# Altium footprint library Tomra_Cadstar_Footprints.PcbLib: 380 footprints (part 1 of 24) (continued)
## BGA138C100P13X13_1400X1400 [mm]
height 2.1
pads (157):
  round 0.5 smd paste+0 mask+0: 1(-6,-6) 2(-6,-4) 3(-6,-3) 4(-6,-2) 5(-6,-1) 6(-6,0) 7(-6,1) 8(-6,2) 9(-6,3) 10(-6,4) 11(-6,6) 12(-5,-4) 13(-5,-3) 14(-5,-2) 15(-5,-1) 16(-5,0) 17(-5,1) 18(-5,2) 19(-5,3) 20(-5,4) 21(-4,-6) 22(-4,-5) 23(-4,-4) 24(-4,-3) 25(-4,-2) 26(-4,-1) 27(-4,0) 28(-4,1) 29(-4,2) 30(-4,3) 31(-4,4) 32(-4,5) 33(-4,6) 34(-3,-6) 35(-3,-5) 36(-3,-4) 37(-3,-3) 38(-3,-2) 39(-3,-1) 40(-3,0) 41(-3,1) 42(-3,2) 43(-3,3) 44(-3,4) 45(-3,5) 46(-3,6) 47(-2,-6) 48(-2,-5) 49(-2,-4) 50(-2,-3) 51(-2,-2) 52(-2,-1) 53(-2,0) 54(-2,1) 55(-2,2) 56(-2,3) 57(-2,4) 58(-2,5) 59(-2,6) 60(-1,-6) 61(-1,-5) 62(-1,-4) 63(-1,-3) 69(-1,3) 70(-1,4) 71(-1,5) 72(-1,6) 73(0,-6) 74(0,-5) 75(0,-4) 76(0,-3) 82(0,3) 83(0,4) 84(0,5) 85(0,6) 86(1,-6) 87(1,-5) 88(1,-4) 89(1,-3) 95(1,3) 96(1,4) 97(1,5) 98(1,6) 99(2,-6) 100(2,-5) 101(2,-4) 102(2,-3) 103(2,-2) 104(2,-1) 105(2,0) 106(2,1) 107(2,2) 108(2,3) 109(2,4) 110(2,5) 111(2,6) 112(3,-6) 113(3,-5) 114(3,-4) 115(3,-3) 116(3,-2) 117(3,-1) 118(3,0) 119(3,1) 120(3,2) 121(3,3) 122(3,4) 123(3,5) 124(3,6) 125(4,-6) 126(4,-5) 127(4,-4) 128(4,-3) 129(4,-2) 130(4,-1) 131(4,0) 132(4,1) 133(4,2) 134(4,3) 135(4,4) 136(4,5) 137(4,6) 138(5,-4) 139(5,-3) 140(5,-2) 141(5,-1) 142(5,0) 143(5,1) 144(5,2) 145(5,3) 146(5,4) 147(6,-6) 148(6,-4) 149(6,-3) 150(6,-2) 151(6,-1) 152(6,0) 153(6,1) 154(6,2) 155(6,3) 156(6,4) 157(6,6)
  round 0 smd paste+0 mask+0: 64(-1,-2) 65(-1,-1) 66(-1,0) 67(-1,1) 68(-1,2) 77(0,-2) 78(0,-1) 79(0,0) 80(0,1) 81(0,2) 90(1,-2) 91(1,-1) 92(1,0) 93(1,1) 94(1,2)
Top Elec:
  region: 4.745,4.749 6.245,4.749 6.245,6.248 4.745,6.248
  region: -6.248,4.748 -4.748,4.748 -4.748,6.247 -6.248,6.247
  region: 4.747,-6.248 6.247,-6.248 6.247,-4.749 4.747,-4.749
  region: -6.252,-6.251 -4.752,-6.251 -4.751,-5.114 -5.107,-4.754 -6.252,-4.752
Top Silk:
  lines w0.1: -6.92,-6.71 -6.72,-6.91 ; -6.92,-6.51 -6.52,-6.91 ; -6.92,-6.31 -6.32,-6.91 ; -6.92,-6.11 -6.12,-6.91 ; -6.92,-5.91 -5.92,-6.91 ; -7,-7 7,-7 7,7 -7,7 -7,-7 ; -5.3,-7.725 cw(c-5.3,-7.6) -5.3,-7.475 cw(c-5.3,-7.6) -5.3,-7.725
  text ".Designator" at -3.599,7.27 h0.7
Top Assembly:
  lines w0.05: -6.92,-6.81 -6.82,-6.91 ; -6.92,-6.71 -6.72,-6.91 ; -6.92,-6.61 -6.62,-6.91 ; -6.92,-6.51 -6.52,-6.91 ; -6.92,-6.41 -6.42,-6.91 ; -6.92,-6.31 -6.32,-6.91 ; -6.92,-6.21 -6.22,-6.91 ; -6.92,-6.11 -6.12,-6.91 ; -6.92,-6.01 -6.02,-6.91 ; -6.92,-5.91 -5.92,-6.91 ; -7,-7 7,-7 7,7 -7,7 -7,-7
Top Placement:
  lines w0.01: -0.5,0 0.5,0 ; 0,-0.5 0,0.5 ; -8.5,-8.5 8.5,-8.5 8.5,8.5 -8.5,8.5 -8.5,-8.5

## BGA320C100P18X18_1900X1900 [mm]
height 2
pads (320):
  round 0.5 smd paste+0 mask+0: A1(-8.5,8.5) A2(-7.5,8.5) A3(-6.5,8.5) A4(-5.5,8.5) A5(-4.5,8.5) A6(-3.5,8.5) A7(-2.5,8.5) A8(-1.5,8.5) A9(-0.5,8.5) A10(0.5,8.5) A11(1.5,8.5) A12(2.5,8.5) A13(3.5,8.5) A14(4.5,8.5) A15(5.5,8.5) A16(6.5,8.5) A17(7.5,8.5) A18(8.5,8.5) B1(-8.5,7.5) B2(-7.5,7.5) B3(-6.5,7.5) B4(-5.5,7.5) B5(-4.5,7.5) B6(-3.5,7.5) B7(-2.5,7.5) B8(-1.5,7.5) B9(-0.5,7.5) B10(0.5,7.5) B11(1.5,7.5) B12(2.5,7.5) B13(3.5,7.5) B14(4.5,7.5) B15(5.5,7.5) B16(6.5,7.5) B17(7.5,7.5) B18(8.5,7.5) C1(-8.5,6.5) C2(-7.5,6.5) C3(-6.5,6.5) C4(-5.5,6.5) C5(-4.5,6.5) C6(-3.5,6.5) C7(-2.5,6.5) C8(-1.5,6.5) C9(-0.5,6.5) C10(0.5,6.5) C11(1.5,6.5) C12(2.5,6.5) C13(3.5,6.5) C14(4.5,6.5) C15(5.5,6.5) C16(6.5,6.5) C17(7.5,6.5) C18(8.5,6.5) D1(-8.5,5.5) D2(-7.5,5.5) D3(-6.5,5.5) D4(-5.5,5.5) D5(-4.5,5.5) D6(-3.5,5.5) D7(-2.5,5.5) D8(-1.5,5.5) D9(-0.5,5.5) D10(0.5,5.5) D11(1.5,5.5) D12(2.5,5.5) D13(3.5,5.5) D14(4.5,5.5) D15(5.5,5.5) D16(6.5,5.5) D17(7.5,5.5) D18(8.5,5.5) E1(-8.5,4.5) E2(-7.5,4.5) E3(-6.5,4.5) E4(-5.5,4.5) E5(-4.5,4.5) E6(-3.5,4.5) E7(-2.5,4.5) E8(-1.5,4.5) E9(-0.5,4.5) E10(0.5,4.5) E11(1.5,4.5) E12(2.5,4.5) E13(3.5,4.5) E14(4.5,4.5) E15(5.5,4.5) E16(6.5,4.5) E17(7.5,4.5) E18(8.5,4.5) F1(-8.5,3.5) F2(-7.5,3.5) F3(-6.5,3.5) F4(-5.5,3.5) F5(-4.5,3.5) F6(-3.5,3.5) F7(-2.5,3.5) F8(-1.5,3.5) F9(-0.5,3.5) F10(0.5,3.5) F11(1.5,3.5) F12(2.5,3.5) F13(3.5,3.5) F14(4.5,3.5) F15(5.5,3.5) F16(6.5,3.5) F17(7.5,3.5) F18(8.5,3.5) G1(-8.5,2.5) G2(-7.5,2.5) G3(-6.5,2.5) G4(-5.5,2.5) G5(-4.5,2.5) G6(-3.5,2.5) G7(-2.5,2.5) G8(-1.5,2.5) G9(-0.5,2.5) G10(0.5,2.5) G11(1.5,2.5) G12(2.5,2.5) G13(3.5,2.5) G14(4.5,2.5) G15(5.5,2.5) G16(6.5,2.5) G17(7.5,2.5) G18(8.5,2.5) H1(-8.5,1.5) H2(-7.5,1.5) H3(-6.5,1.5) H4(-5.5,1.5) H5(-4.5,1.5) H6(-3.5,1.5) H7(-2.5,1.5) H8(-1.5,1.5) H9(-0.5,1.5) H10(0.5,1.5) H11(1.5,1.5) H12(2.5,1.5) H13(3.5,1.5) H14(4.5,1.5) H15(5.5,1.5) H16(6.5,1.5) H17(7.5,1.5) H18(8.5,1.5) J1(-8.5,0.5) J2(-7.5,0.5) J3(-6.5,0.5) J4(-5.5,0.5) J5(-4.5,0.5) J6(-3.5,0.5) J7(-2.5,0.5) J8(-1.5,0.5) J11(1.5,0.5) J12(2.5,0.5) J13(3.5,0.5) J14(4.5,0.5) J15(5.5,0.5) J16(6.5,0.5) J17(7.5,0.5) J18(8.5,0.5) K1(-8.5,-0.5) K2(-7.5,-0.5) K3(-6.5,-0.5) K4(-5.5,-0.5) K5(-4.5,-0.5) K6(-3.5,-0.5) K7(-2.5,-0.5) K8(-1.5,-0.5) K11(1.5,-0.5) K12(2.5,-0.5) K13(3.5,-0.5) K14(4.5,-0.5) K15(5.5,-0.5) K16(6.5,-0.5) K17(7.5,-0.5) K18(8.5,-0.5) L1(-8.5,-1.5) L2(-7.5,-1.5) L3(-6.5,-1.5) L4(-5.5,-1.5) L5(-4.5,-1.5) L6(-3.5,-1.5) L7(-2.5,-1.5) L8(-1.5,-1.5) L9(-0.5,-1.5) L10(0.5,-1.5) L11(1.5,-1.5) L12(2.5,-1.5) L13(3.5,-1.5) L14(4.5,-1.5) L15(5.5,-1.5) L16(6.5,-1.5) L17(7.5,-1.5) L18(8.5,-1.5) M1(-8.5,-2.5) M2(-7.5,-2.5) M3(-6.5,-2.5) M4(-5.5,-2.5) M5(-4.5,-2.5) M6(-3.5,-2.5) M7(-2.5,-2.5) M8(-1.5,-2.5) M9(-0.5,-2.5) M10(0.5,-2.5) M11(1.5,-2.5) M12(2.5,-2.5) M13(3.5,-2.5) M14(4.5,-2.5) M15(5.5,-2.5) M16(6.5,-2.5) M17(7.5,-2.5) M18(8.5,-2.5) N1(-8.5,-3.5) N2(-7.5,-3.5) N3(-6.5,-3.5) N4(-5.5,-3.5) N5(-4.5,-3.5) N6(-3.5,-3.5) N7(-2.5,-3.5) N8(-1.5,-3.5) N9(-0.5,-3.5) N10(0.5,-3.5) N11(1.5,-3.5) N12(2.5,-3.5) N13(3.5,-3.5) N14(4.5,-3.5) N15(5.5,-3.5) N16(6.5,-3.5) N17(7.5,-3.5) N18(8.5,-3.5) P1(-8.5,-4.5) P2(-7.5,-4.5) P3(-6.5,-4.5) P4(-5.5,-4.5) P5(-4.5,-4.5) P6(-3.5,-4.5) P7(-2.5,-4.5) P8(-1.5,-4.5) P9(-0.5,-4.5) P10(0.5,-4.5) P11(1.5,-4.5) P12(2.5,-4.5) P13(3.5,-4.5) P14(4.5,-4.5) P15(5.5,-4.5) P16(6.5,-4.5) P17(7.5,-4.5) P18(8.5,-4.5) R1(-8.5,-5.5) R2(-7.5,-5.5) R3(-6.5,-5.5) R4(-5.5,-5.5) R5(-4.5,-5.5) R6(-3.5,-5.5) R7(-2.5,-5.5) R8(-1.5,-5.5) R9(-0.5,-5.5) R10(0.5,-5.5) R11(1.5,-5.5) R12(2.5,-5.5) R13(3.5,-5.5) R14(4.5,-5.5) R15(5.5,-5.5) R16(6.5,-5.5) R17(7.5,-5.5) R18(8.5,-5.5) T1(-8.5,-6.5) T2(-7.5,-6.5) T3(-6.5,-6.5) T4(-5.5,-6.5) T5(-4.5,-6.5) T6(-3.5,-6.5) T7(-2.5,-6.5) T8(-1.5,-6.5) T9(-0.5,-6.5) T10(0.5,-6.5) T11(1.5,-6.5) T12(2.5,-6.5) T13(3.5,-6.5) T14(4.5,-6.5) T15(5.5,-6.5) T16(6.5,-6.5) T17(7.5,-6.5) T18(8.5,-6.5) U1(-8.5,-7.5) U2(-7.5,-7.5) U3(-6.5,-7.5) U4(-5.5,-7.5) U5(-4.5,-7.5) U6(-3.5,-7.5) U7(-2.5,-7.5) U8(-1.5,-7.5) U9(-0.5,-7.5) U10(0.5,-7.5) U11(1.5,-7.5) U12(2.5,-7.5) U13(3.5,-7.5) U14(4.5,-7.5) U15(5.5,-7.5) U16(6.5,-7.5) U17(7.5,-7.5) U18(8.5,-7.5) V1(-8.5,-8.5) V2(-7.5,-8.5) V3(-6.5,-8.5) V4(-5.5,-8.5) V5(-4.5,-8.5) V6(-3.5,-8.5) V7(-2.5,-8.5) V8(-1.5,-8.5) V9(-0.5,-8.5) V10(0.5,-8.5) V11(1.5,-8.5) V12(2.5,-8.5) V13(3.5,-8.5) V14(4.5,-8.5) V15(5.5,-8.5) V16(6.5,-8.5) V17(7.5,-8.5) V18(8.5,-8.5)
Top Silk:
  lines w0.1: -9.5,8.5 -8.5,9.5 ; -9.5,8.7 -8.7,9.5 ; -9.5,8.9 -8.9,9.5 ; -9.5,9.1 -9.1,9.5 ; -9.5,9.3 -9.3,9.5 ; -10.225,8.5 cw(c-10.1,8.5) -9.975,8.5 cw(c-10.1,8.5) -10.225,8.5 ; -9.5,-9.5 -9.5,9.5 9.5,9.5 9.5,-9.5 -9.5,-9.5
  text ".Designator" at -9.5,9.5 h0.7
Top Assembly:
  lines w0.05: -9.5,8.5 -8.5,9.5 ; -9.5,8.6 -8.6,9.5 ; -9.5,8.7 -8.7,9.5 ; -9.5,8.8 -8.8,9.5 ; -9.5,8.9 -8.9,9.5 ; -9.5,9 -9,9.5 ; -9.5,9.1 -9.1,9.5 ; -9.5,9.2 -9.2,9.5 ; -9.5,9.3 -9.3,9.5 ; -9.5,9.4 -9.4,9.5 ; -9.5,-9.5 -9.5,9.5 9.5,9.5 9.5,-9.5 -9.5,-9.5
Top Placement:
  lines w0.01: -0.5,0 0.5,0 ; 0,-0.5 0,0.5 ; -11.5,-11.5 -11.5,11.5 11.5,11.5 11.5,-11.5 -11.5,-11.5

## BGA324C80P18X18_1500X1500 [mm]
height 1.5
pads (326):
  round 1 smd paste+0 mask+0: 1(-8.5,-8.5) 2(8.5,8.5)
  round 0.4 smd paste+0 mask+0: 3(-6.8,6.8) 4(-6,6.8) 5(-5.2,6.8) 6(-4.4,6.8) 7(-3.6,6.8) 8(-2.8,6.8) 9(-2,6.8) 10(-1.2,6.8) 11(-0.4,6.8) 12(0.4,6.8) 13(1.2,6.8) 14(2,6.8) 15(2.8,6.8) 16(3.6,6.8) 17(4.4,6.8) 18(5.2,6.8) 19(6,6.8) 20(6.8,6.8) 21(-6.8,6) 22(-6,6) 23(-5.2,6) 24(-4.4,6) 25(-3.6,6) 26(-2.8,6) 27(-2,6) 28(-1.2,6) 29(-0.4,6) 30(0.4,6) 31(1.2,6) 32(2,6) 33(2.8,6) 34(3.6,6) 35(4.4,6) 36(5.2,6) 37(6,6) 38(6.8,6) 39(-6.8,5.2) 40(-6,5.2) 41(-5.2,5.2) 42(-4.4,5.2) 43(-3.6,5.2) 44(-2.8,5.2) 45(-2,5.2) 46(-1.2,5.2) 47(-0.4,5.2) 48(0.4,5.2) 49(1.2,5.2) 50(2,5.2) 51(2.8,5.2) 52(3.6,5.2) 53(4.4,5.2) 54(5.2,5.2) 55(6,5.2) 56(6.8,5.2) 57(-6.8,4.4) 58(-6,4.4) 59(-5.2,4.4) 60(-4.4,4.4) 61(-3.6,4.4) 62(-2.8,4.4) 63(-2,4.4) 64(-1.2,4.4) 65(-0.4,4.4) 66(0.4,4.4) 67(1.2,4.4) 68(2,4.4) 69(2.8,4.4) 70(3.6,4.4) 71(4.4,4.4) 72(5.2,4.4) 73(6,4.4) 74(6.8,4.4) 75(-6.8,3.6) 76(-6,3.6) 77(-5.2,3.6) 78(-4.4,3.6) 79(-3.6,3.6) 80(-2.8,3.6) 81(-2,3.6) 82(-1.2,3.6) 83(-0.4,3.6) 84(0.4,3.6) 85(1.2,3.6) 86(2,3.6) 87(2.8,3.6) 88(3.6,3.6) 89(4.4,3.6) 90(5.2,3.6) 91(6,3.6) 92(6.8,3.6) 93(-6.8,2.8) 94(-6,2.8) 95(-5.2,2.8) 96(-4.4,2.8) 97(-3.6,2.8) 98(-2.8,2.8) 99(-2,2.8) 100(-1.2,2.8) 101(-0.4,2.8) 102(0.4,2.8) 103(1.2,2.8) 104(2,2.8) 105(2.8,2.8) 106(3.6,2.8) 107(4.4,2.8) 108(5.2,2.8) 109(6,2.8) 110(6.8,2.8) 111(-6.8,2) 112(-6,2) 113(-5.2,2) 114(-4.4,2) 115(-3.6,2) 116(-2.8,2) 117(-2,2) 118(-1.2,2) 119(-0.4,2) 120(0.4,2) 121(1.2,2) 122(2,2) 123(2.8,2) 124(3.6,2) 125(4.4,2) 126(5.2,2) 127(6,2) 128(6.8,2) 129(-6.8,1.2) 130(-6,1.2) 131(-5.2,1.2) 132(-4.4,1.2) 133(-3.6,1.2) 134(-2.8,1.2) 135(-2,1.2) 136(-1.2,1.2) 137(-0.4,1.2) 138(0.4,1.2) 139(1.2,1.2) 140(2,1.2) 141(2.8,1.2) 142(3.6,1.2) 143(4.4,1.2) 144(5.2,1.2) 145(6,1.2) 146(6.8,1.2) 147(-6.8,0.4) 148(-6,0.4) 149(-5.2,0.4) 150(-4.4,0.4) 151(-3.6,0.4) 152(-2.8,0.4) 153(-2,0.4) 154(-1.2,0.4) 155(-0.4,0.4) 156(0.4,0.4) 157(1.2,0.4) 158(2,0.4) 159(2.8,0.4) 160(3.6,0.4) 161(4.4,0.4) 162(5.2,0.4) 163(6,0.4) 164(6.8,0.4) 165(-6.8,-0.4) 166(-6,-0.4) 167(-5.2,-0.4) 168(-4.4,-0.4) 169(-3.6,-0.4) 170(-2.8,-0.4) 171(-2,-0.4) 172(-1.2,-0.4) 173(-0.4,-0.4) 174(0.4,-0.4) 175(1.2,-0.4) 176(2,-0.4) 177(2.8,-0.4) 178(3.6,-0.4) 179(4.4,-0.4) 180(5.2,-0.4) 181(6,-0.4) 182(6.8,-0.4) 183(-6.8,-1.2) 184(-6,-1.2) 185(-5.2,-1.2) 186(-4.4,-1.2) 187(-3.6,-1.2) 188(-2.8,-1.2) 189(-2,-1.2) 190(-1.2,-1.2) 191(-0.4,-1.2) 192(0.4,-1.2) 193(1.2,-1.2) 194(2,-1.2) 195(2.8,-1.2) 196(3.6,-1.2) 197(4.4,-1.2) 198(5.2,-1.2) 199(6,-1.2) 200(6.8,-1.2) 201(-6.8,-2) 202(-6,-2) 203(-5.2,-2) 204(-4.4,-2) 205(-3.6,-2) 206(-2.8,-2) 207(-2,-2) 208(-1.2,-2) 209(-0.4,-2) 210(0.4,-2) 211(1.2,-2) 212(2,-2) 213(2.8,-2) 214(3.6,-2) 215(4.4,-2) 216(5.2,-2) 217(6,-2) 218(6.8,-2) 219(-6.8,-2.8) 220(-6,-2.8) 221(-5.2,-2.8) 222(-4.4,-2.8) 223(-3.6,-2.8) 224(-2.8,-2.8) 225(-2,-2.8) 226(-1.2,-2.8) 227(-0.4,-2.8) 228(0.4,-2.8) 229(1.2,-2.8) 230(2,-2.8) 231(2.8,-2.8) 232(3.6,-2.8) 233(4.4,-2.8) 234(5.2,-2.8) 235(6,-2.8) 236(6.8,-2.8) 237(-6.8,-3.6) 238(-6,-3.6) 239(-5.2,-3.6) 240(-4.4,-3.6) 241(-3.6,-3.6) 242(-2.8,-3.6) 243(-2,-3.6) 244(-1.2,-3.6) 245(-0.4,-3.6) 246(0.4,-3.6) 247(1.2,-3.6) 248(2,-3.6) 249(2.8,-3.6) 250(3.6,-3.6) 251(4.4,-3.6) 252(5.2,-3.6) 253(6,-3.6) 254(6.8,-3.6) 255(-6.8,-4.4) 256(-6,-4.4) 257(-5.2,-4.4) 258(-4.4,-4.4) 259(-3.6,-4.4) 260(-2.8,-4.4) 261(-2,-4.4) 262(-1.2,-4.4) 263(-0.4,-4.4) 264(0.4,-4.4) 265(1.2,-4.4) 266(2,-4.4) 267(2.8,-4.4) 268(3.6,-4.4) 269(4.4,-4.4) 270(5.2,-4.4) 271(6,-4.4) 272(6.8,-4.4) 273(-6.8,-5.2) 274(-6,-5.2) 275(-5.2,-5.2) 276(-4.4,-5.2) 277(-3.6,-5.2) 278(-2.8,-5.2) 279(-2,-5.2) 280(-1.2,-5.2) 281(-0.4,-5.2) 282(0.4,-5.2) 283(1.2,-5.2) 284(2,-5.2) 285(2.8,-5.2) 286(3.6,-5.2) 287(4.4,-5.2) 288(5.2,-5.2) 289(6,-5.2) 290(6.8,-5.2) 291(-6.8,-6) 292(-6,-6) 293(-5.2,-6) 294(-4.4,-6) 295(-3.6,-6) 296(-2.8,-6) 297(-2,-6) 298(-1.2,-6) 299(-0.4,-6) 300(0.4,-6) 301(1.2,-6) 302(2,-6) 303(2.8,-6) 304(3.6,-6) 305(4.4,-6) 306(5.2,-6) 307(6,-6) 308(6.8,-6) 309(-6.8,-6.8) 310(-6,-6.8) 311(-5.2,-6.8) 312(-4.4,-6.8) 313(-3.6,-6.8) 314(-2.8,-6.8) 315(-2,-6.8) 316(-1.2,-6.8) 317(-0.4,-6.8) 318(0.4,-6.8) 319(1.2,-6.8) 320(2,-6.8) 321(2.8,-6.8) 322(3.6,-6.8) 323(4.4,-6.8) 324(5.2,-6.8) 325(6,-6.8) 326(6.8,-6.8)
Top Silk:
  lines w0.1: -7.85,6.8 cw(c-7.725,6.8) -7.6,6.8 cw(c-7.725,6.8) -7.85,6.8 ; -7.5,-7.5 -7.5,7 -7,7.5 7.5,7.5 7.5,-7.5 -7.5,-7.5
  text ".Designator" at -3.599,9.65 h0.7
Top Assembly:
  lines w0.05: -7.85,6.8 cw(c-7.725,6.8) -7.6,6.8 cw(c-7.725,6.8) -7.85,6.8 ; -7.5,-7.5 -7.5,7 -7,7.5 7.5,7.5 7.5,-7.5 -7.5,-7.5
Top Placement:
  lines w0.01: -0.5,0 0.5,0 ; 0,-0.5 0,0.5 ; -8.5,-8.5 -8.5,8.5 8.5,8.5 8.5,-8.5 -8.5,-8.5

## BGA676C100P26X26_2700X2700X337 (N) [mm]
height 3.37
pads (676):
  round 0.45 smd paste+0 mask+0: 1(-12.5,-12.5) 2(-12.5,-11.5) 3(-12.5,-10.5) 4(-12.5,-9.5) 5(-12.5,-8.5) 6(-12.5,-7.5) 7(-12.5,-6.5) 8(-12.5,-5.5) 9(-12.5,-4.5) 10(-12.5,-3.5) 11(-12.5,-2.5) 12(-12.5,-1.5) 13(-12.5,-0.5) 14(-12.5,0.5) 15(-12.5,1.5) 16(-12.5,2.5) 17(-12.5,3.5) 18(-12.5,4.5) 19(-12.5,5.5) 20(-12.5,6.5) 21(-12.5,7.5) 22(-12.5,8.5) 23(-12.5,9.5) 24(-12.5,10.5) 25(-12.5,11.5) 26(-12.5,12.5) 27(7.5,-12.5) 28(7.5,-11.5) 29(7.5,-10.5) 30(7.5,-9.5) 31(7.5,-8.5) 32(7.5,-7.5) 33(7.5,-6.5) 34(7.5,-5.5) 35(7.5,-4.5) 36(7.5,-3.5) 37(7.5,-2.5) 38(7.5,-1.5) 39(7.5,-0.5) 40(7.5,0.5) 41(7.5,1.5) 42(7.5,2.5) 43(7.5,3.5) 44(7.5,4.5) 45(7.5,5.5) 46(7.5,6.5) 47(7.5,7.5) 48(7.5,8.5) 49(7.5,9.5) 50(7.5,10.5) 51(7.5,11.5) 52(7.5,12.5) 53(8.5,-12.5) 54(8.5,-11.5) 55(8.5,-10.5) 56(8.5,-9.5) 57(8.5,-8.5) 58(8.5,-7.5) 59(8.5,-6.5) 60(8.5,-5.5) 61(8.5,-4.5) 62(8.5,-3.5) 63(8.5,-2.5) 64(8.5,-1.5) 65(8.5,-0.5) 66(8.5,0.5) 67(8.5,1.5) 68(8.5,2.5) 69(8.5,3.5) 70(8.5,4.5) 71(8.5,5.5) 72(8.5,6.5) 73(8.5,7.5) 74(8.5,8.5) 75(8.5,9.5) 76(8.5,10.5) 77(8.5,11.5) 78(8.5,12.5) 79(9.5,-12.5) 80(9.5,-11.5) 81(9.5,-10.5) 82(9.5,-9.5) 83(9.5,-8.5) 84(9.5,-7.5) 85(9.5,-6.5) 86(9.5,-5.5) 87(9.5,-4.5) 88(9.5,-3.5) 89(9.5,-2.5) 90(9.5,-1.5) 91(9.5,-0.5) 92(9.5,0.5) 93(9.5,1.5) 94(9.5,2.5) 95(9.5,3.5) 96(9.5,4.5) 97(9.5,5.5) 98(9.5,6.5) 99(9.5,7.5) 100(9.5,8.5) 101(9.5,9.5) 102(9.5,10.5) 103(9.5,11.5) 104(9.5,12.5) 105(10.5,-12.5) 106(10.5,-11.5) 107(10.5,-10.5) 108(10.5,-9.5) 109(10.5,-8.5) 110(10.5,-7.5) 111(10.5,-6.5) 112(10.5,-5.5) 113(10.5,-4.5) 114(10.5,-3.5) 115(10.5,-2.5) 116(10.5,-1.5) 117(10.5,-0.5) 118(10.5,0.5) 119(10.5,1.5) 120(10.5,2.5) 121(10.5,3.5) 122(10.5,4.5) 123(10.5,5.5) 124(10.5,6.5) 125(10.5,7.5) 126(10.5,8.5) 127(10.5,9.5) 128(10.5,10.5) 129(10.5,11.5) 130(10.5,12.5) 131(11.5,-12.5) 132(11.5,-11.5) 133(11.5,-10.5) 134(11.5,-9.5) 135(11.5,-8.5) 136(11.5,-7.5) 137(11.5,-6.5) 138(11.5,-5.5) 139(11.5,-4.5) 140(11.5,-3.5) 141(11.5,-2.5) 142(11.5,-1.5) 143(11.5,-0.5) 144(11.5,0.5) 145(11.5,1.5) 146(11.5,2.5) 147(11.5,3.5) 148(11.5,4.5) 149(11.5,5.5) 150(11.5,6.5) 151(11.5,7.5) 152(11.5,8.5) 153(11.5,9.5) 154(11.5,10.5) 155(11.5,11.5) 156(11.5,12.5) 157(12.5,-12.5) 158(12.5,-11.5) 159(12.5,-10.5) 160(12.5,-9.5) 161(12.5,-8.5) 162(12.5,-7.5) 163(12.5,-6.5) 164(12.5,-5.5) 165(12.5,-4.5) 166(12.5,-3.5) 167(12.5,-2.5) 168(12.5,-1.5) 169(12.5,-0.5) 170(12.5,0.5) 171(12.5,1.5) 172(12.5,2.5) 173(12.5,3.5) 174(12.5,4.5) 175(12.5,5.5) 176(12.5,6.5) 177(12.5,7.5) 178(12.5,8.5) 179(12.5,9.5) 180(12.5,10.5) 181(12.5,11.5) 182(12.5,12.5) 183(-11.5,-12.5) 184(-11.5,-11.5) 185(-11.5,-10.5) 186(-11.5,-9.5) 187(-11.5,-8.5) 188(-11.5,-7.5) 189(-11.5,-6.5) 190(-11.5,-5.5) 191(-11.5,-4.5) 192(-11.5,-3.5) 193(-11.5,-2.5) 194(-11.5,-1.5) 195(-11.5,-0.5) 196(-11.5,0.5) 197(-11.5,1.5) 198(-11.5,2.5) 199(-11.5,3.5) 200(-11.5,4.5) 201(-11.5,5.5) 202(-11.5,6.5) 203(-11.5,7.5) 204(-11.5,8.5) 205(-11.5,9.5) 206(-11.5,10.5) 207(-11.5,11.5) 208(-11.5,12.5) 209(-10.5,-12.5) 210(-10.5,-11.5) 211(-10.5,-10.5) 212(-10.5,-9.5) 213(-10.5,-8.5) 214(-10.5,-7.5) 215(-10.5,-6.5) 216(-10.5,-5.5) 217(-10.5,-4.5) 218(-10.5,-3.5) 219(-10.5,-2.5) 220(-10.5,-1.5) 221(-10.5,-0.5) 222(-10.5,0.5) 223(-10.5,1.5) 224(-10.5,2.5) 225(-10.5,3.5) 226(-10.5,4.5) 227(-10.5,5.5) 228(-10.5,6.5) 229(-10.5,7.5) 230(-10.5,8.5) 231(-10.5,9.5) 232(-10.5,10.5) 233(-10.5,11.5) 234(-10.5,12.5) 235(-9.5,-12.5) 236(-9.5,-11.5) 237(-9.5,-10.5) 238(-9.5,-9.5) 239(-9.5,-8.5) 240(-9.5,-7.5) 241(-9.5,-6.5) 242(-9.5,-5.5) 243(-9.5,-4.5) 244(-9.5,-3.5) 245(-9.5,-2.5) 246(-9.5,-1.5) 247(-9.5,-0.5) 248(-9.5,0.5) 249(-9.5,1.5) 250(-9.5,2.5) 251(-9.5,3.5) 252(-9.5,4.5) 253(-9.5,5.5) 254(-9.5,6.5) 255(-9.5,7.5) 256(-9.5,8.5) 257(-9.5,9.5) 258(-9.5,10.5) 259(-9.5,11.5) 260(-9.5,12.5) 261(-8.5,-12.5) 262(-8.5,-11.5) 263(-8.5,-10.5) 264(-8.5,-9.5) 265(-8.5,-8.5) 266(-8.5,-7.5) 267(-8.5,-6.5) 268(-8.5,-5.5) 269(-8.5,-4.5) 270(-8.5,-3.5) 271(-8.5,-2.5) 272(-8.5,-1.5) 273(-8.5,-0.5) 274(-8.5,0.5) 275(-8.5,1.5) 276(-8.5,2.5) 277(-8.5,3.5) 278(-8.5,4.5) 279(-8.5,5.5) 280(-8.5,6.5) 281(-8.5,7.5) 282(-8.5,8.5) 283(-8.5,9.5) 284(-8.5,10.5) 285(-8.5,11.5) 286(-8.5,12.5) 287(-7.5,-12.5) 288(-7.5,-11.5) 289(-7.5,-10.5) 290(-7.5,-9.5) 291(-7.5,-8.5) 292(-7.5,-7.5) 293(-7.5,-6.5) 294(-7.5,-5.5) 295(-7.5,-4.5) 296(-7.5,-3.5) 297(-7.5,-2.5) 298(-7.5,-1.5) 299(-7.5,-0.5) 300(-7.5,0.5) 301(-7.5,1.5) 302(-7.5,2.5) 303(-7.5,3.5) 304(-7.5,4.5) 305(-7.5,5.5) 306(-7.5,6.5) 307(-7.5,7.5) 308(-7.5,8.5) 309(-7.5,9.5) 310(-7.5,10.5) 311(-7.5,11.5) 312(-7.5,12.5) 313(-6.5,-12.5) 314(-6.5,-11.5) 315(-6.5,-10.5) 316(-6.5,-9.5) 317(-6.5,-8.5) 318(-6.5,-7.5) 319(-6.5,-6.5) 320(-6.5,-5.5) 321(-6.5,-4.5) 322(-6.5,-3.5) 323(-6.5,-2.5) 324(-6.5,-1.5) 325(-6.5,-0.5) 326(-6.5,0.5) 327(-6.5,1.5) 328(-6.5,2.5) 329(-6.5,3.5) 330(-6.5,4.5) 331(-6.5,5.5) 332(-6.5,6.5) 333(-6.5,7.5) 334(-6.5,8.5) 335(-6.5,9.5) 336(-6.5,10.5) 337(-6.5,11.5) 338(-6.5,12.5) 339(-5.5,-12.5) 340(-5.5,-11.5) 341(-5.5,-10.5) 342(-5.5,-9.5) 343(-5.5,-8.5) 344(-5.5,-7.5) 345(-5.5,-6.5) 346(-5.5,-5.5) 347(-5.5,-4.5) 348(-5.5,-3.5) 349(-5.5,-2.5) 350(-5.5,-1.5) 351(-5.5,-0.5) 352(-5.5,0.5) 353(-5.5,1.5) 354(-5.5,2.5) 355(-5.5,3.5) 356(-5.5,4.5) 357(-5.5,5.5) 358(-5.5,6.5) 359(-5.5,7.5) 360(-5.5,8.5) 361(-5.5,9.5) 362(-5.5,10.5) 363(-5.5,11.5) 364(-5.5,12.5) 365(-4.5,-12.5) 366(-4.5,-11.5) 367(-4.5,-10.5) 368(-4.5,-9.5) 369(-4.5,-8.5) 370(-4.5,-7.5) 371(-4.5,-6.5) 372(-4.5,-5.5) 373(-4.5,-4.5) 374(-4.5,-3.5) 375(-4.5,-2.5) 376(-4.5,-1.5) 377(-4.5,-0.5) 378(-4.5,0.5) 379(-4.5,1.5) 380(-4.5,2.5) 381(-4.5,3.5) 382(-4.5,4.5) 383(-4.5,5.5) 384(-4.5,6.5) 385(-4.5,7.5) 386(-4.5,8.5) 387(-4.5,9.5) 388(-4.5,10.5) 389(-4.5,11.5) 390(-4.5,12.5) 391(-3.5,-12.5) 392(-3.5,-11.5) 393(-3.5,-10.5) 394(-3.5,-9.5) 395(-3.5,-8.5) 396(-3.5,-7.5) 397(-3.5,-6.5) 398(-3.5,-5.5) 399(-3.5,-4.5) 400(-3.5,-3.5) 401(-3.5,-2.5) 402(-3.5,-1.5) 403(-3.5,-0.5) 404(-3.5,0.5) 405(-3.5,1.5) 406(-3.5,2.5) 407(-3.5,3.5) 408(-3.5,4.5) 409(-3.5,5.5) 410(-3.5,6.5) 411(-3.5,7.5) 412(-3.5,8.5) 413(-3.5,9.5) 414(-3.5,10.5) 415(-3.5,11.5) 416(-3.5,12.5) 417(-2.5,-12.5) 418(-2.5,-11.5) 419(-2.5,-10.5) 420(-2.5,-9.5) 421(-2.5,-8.5) 422(-2.5,-7.5) 423(-2.5,-6.5) 424(-2.5,-5.5) 425(-2.5,-4.5) 426(-2.5,-3.5) 427(-2.5,-2.5) 428(-2.5,-1.5) 429(-2.5,-0.5) 430(-2.5,0.5) 431(-2.5,1.5) 432(-2.5,2.5) 433(-2.5,3.5) 434(-2.5,4.5) 435(-2.5,5.5) 436(-2.5,6.5) 437(-2.5,7.5) 438(-2.5,8.5) 439(-2.5,9.5) 440(-2.5,10.5) 441(-2.5,11.5) 442(-2.5,12.5) 443(-1.5,-12.5) 444(-1.5,-11.5) 445(-1.5,-10.5) 446(-1.5,-9.5) 447(-1.5,-8.5) 448(-1.5,-7.5) 449(-1.5,-6.5) 450(-1.5,-5.5) 451(-1.5,-4.5) 452(-1.5,-3.5) 453(-1.5,-2.5) 454(-1.5,-1.5) 455(-1.5,-0.5) 456(-1.5,0.5) 457(-1.5,1.5) 458(-1.5,2.5) 459(-1.5,3.5) 460(-1.5,4.5) 461(-1.5,5.5) 462(-1.5,6.5) 463(-1.5,7.5) 464(-1.5,8.5) 465(-1.5,9.5) 466(-1.5,10.5) 467(-1.5,11.5) 468(-1.5,12.5) 469(-0.5,-12.5) 470(-0.5,-11.5) 471(-0.5,-10.5) 472(-0.5,-9.5) 473(-0.5,-8.5) 474(-0.5,-7.5) 475(-0.5,-6.5) 476(-0.5,-5.5) 477(-0.5,-4.5) 478(-0.5,-3.5) 479(-0.5,-2.5) 480(-0.5,-1.5) 481(-0.5,-0.5) 482(-0.5,0.5) 483(-0.5,1.5) 484(-0.5,2.5) 485(-0.5,3.5) 486(-0.5,4.5) 487(-0.5,5.5) 488(-0.5,6.5) 489(-0.5,7.5) 490(-0.5,8.5) 491(-0.5,9.5) 492(-0.5,10.5) 493(-0.5,11.5) 494(-0.5,12.5) 495(0.5,-12.5) 496(0.5,-11.5) 497(0.5,-10.5) 498(0.5,-9.5) 499(0.5,-8.5) 500(0.5,-7.5) 501(0.5,-6.5) 502(0.5,-5.5) 503(0.5,-4.5) 504(0.5,-3.5) 505(0.5,-2.5) 506(0.5,-1.5) 507(0.5,-0.5) 508(0.5,0.5) 509(0.5,1.5) 510(0.5,2.5) 511(0.5,3.5) 512(0.5,4.5) 513(0.5,5.5) 514(0.5,6.5) 515(0.5,7.5) 516(0.5,8.5) 517(0.5,9.5) 518(0.5,10.5) 519(0.5,11.5) 520(0.5,12.5) 521(1.5,-12.5) 522(1.5,-11.5) 523(1.5,-10.5) 524(1.5,-9.5) 525(1.5,-8.5) 526(1.5,-7.5) 527(1.5,-6.5) 528(1.5,-5.5) 529(1.5,-4.5) 530(1.5,-3.5) 531(1.5,-2.5) 532(1.5,-1.5) 533(1.5,-0.5) 534(1.5,0.5) 535(1.5,1.5) 536(1.5,2.5) 537(1.5,3.5) 538(1.5,4.5) 539(1.5,5.5) 540(1.5,6.5) 541(1.5,7.5) 542(1.5,8.5) 543(1.5,9.5) 544(1.5,10.5) 545(1.5,11.5) 546(1.5,12.5) 547(2.5,-12.5) 548(2.5,-11.5) 549(2.5,-10.5) 550(2.5,-9.5) 551(2.5,-8.5) 552(2.5,-7.5) 553(2.5,-6.5) 554(2.5,-5.5) 555(2.5,-4.5) 556(2.5,-3.5) 557(2.5,-2.5) 558(2.5,-1.5) 559(2.5,-0.5) 560(2.5,0.5) 561(2.5,1.5) 562(2.5,2.5) 563(2.5,3.5) 564(2.5,4.5) 565(2.5,5.5) 566(2.5,6.5) 567(2.5,7.5) 568(2.5,8.5) 569(2.5,9.5) 570(2.5,10.5) 571(2.5,11.5) 572(2.5,12.5) 573(3.5,-12.5) 574(3.5,-11.5) 575(3.5,-10.5) 576(3.5,-9.5) 577(3.5,-8.5) 578(3.5,-7.5) 579(3.5,-6.5) 580(3.5,-5.5) 581(3.5,-4.5) 582(3.5,-3.5) 583(3.5,-2.5) 584(3.5,-1.5) 585(3.5,-0.5) 586(3.5,0.5) 587(3.5,1.5) 588(3.5,2.5) 589(3.5,3.5) 590(3.5,4.5) 591(3.5,5.5) 592(3.5,6.5) 593(3.5,7.5) 594(3.5,8.5) 595(3.5,9.5) 596(3.5,10.5) 597(3.5,11.5) 598(3.5,12.5) 599(4.5,-12.5) 600(4.5,-11.5) 601(4.5,-10.5) 602(4.5,-9.5) 603(4.5,-8.5) 604(4.5,-7.5) 605(4.5,-6.5) 606(4.5,-5.5) 607(4.5,-4.5) 608(4.5,-3.5) 609(4.5,-2.5) 610(4.5,-1.5) 611(4.5,-0.5) 612(4.5,0.5) 613(4.5,1.5) 614(4.5,2.5) 615(4.5,3.5) 616(4.5,4.5) 617(4.5,5.5) 618(4.5,6.5) 619(4.5,7.5) 620(4.5,8.5) 621(4.5,9.5) 622(4.5,10.5) 623(4.5,11.5) 624(4.5,12.5) 625(5.5,-12.5) 626(5.5,-11.5) 627(5.5,-10.5) 628(5.5,-9.5) 629(5.5,-8.5) 630(5.5,-7.5) 631(5.5,-6.5) 632(5.5,-5.5) 633(5.5,-4.5) 634(5.5,-3.5) 635(5.5,-2.5) 636(5.5,-1.5) 637(5.5,-0.5) 638(5.5,0.5) 639(5.5,1.5) 640(5.5,2.5) 641(5.5,3.5) 642(5.5,4.5) 643(5.5,5.5) 644(5.5,6.5) 645(5.5,7.5) 646(5.5,8.5) 647(5.5,9.5) 648(5.5,10.5) 649(5.5,11.5) 650(5.5,12.5) 651(6.5,-12.5) 652(6.5,-11.5) 653(6.5,-10.5) 654(6.5,-9.5) 655(6.5,-8.5) 656(6.5,-7.5) 657(6.5,-6.5) 658(6.5,-5.5) 659(6.5,-4.5) 660(6.5,-3.5) 661(6.5,-2.5) 662(6.5,-1.5) 663(6.5,-0.5) 664(6.5,0.5) 665(6.5,1.5) 666(6.5,2.5) 667(6.5,3.5) 668(6.5,4.5) 669(6.5,5.5) 670(6.5,6.5) 671(6.5,7.5) 672(6.5,8.5) 673(6.5,9.5) 674(6.5,10.5) 675(6.5,11.5) 676(6.5,12.5)
Top Silk:
  region: -13.71,-13.61 -13.71,-13.569 -13.651,-13.51 -13.569,-13.51 -13.51,-13.569 -13.51,-13.61 -13.51,-13.651 -13.569,-13.71 -13.651,-13.71 -13.71,-13.651
  lines w0.1: -13.61,-8.53 -13.61,-12.3 -12.3,-13.61 -8.53,-13.61 ; -13.61,8.53 -13.61,13.61 -8.53,13.61 ; 8.53,-13.61 13.61,-13.61 13.61,-8.53 ; 8.53,13.61 13.61,13.61 13.61,8.53
  text ".Designator" at -3.599,-0.35 h0.7
Top Assembly:
  lines w0.05: -13.55,-12.28 -12.28,-13.55 13.55,-13.55 13.55,13.55 -13.55,13.55 -13.55,-12.28
Top Placement:
  lines w0.01: -14.05,-12.8 -12.8,-14.05 14.05,-14.05 14.05,14.05 -14.05,14.05 -14.05,-12.8
  lines w0.05: -0.35,0 0.35,0 ; 0,-0.35 0,0.35 ; -0.25,0 cw(c0,0) 0.25,0 cw(c0,0) -0.25,0